# Altium footprint library ParsaLibrary.PcbLib: 526 footprints (part 7 of 33)
Each footprint in its own frame and in the unit in brackets; x right, y up, seen from the top. Pads: shape width x height; smd on the part's side, far side on the other; paste and mask are expansions set on the pad; w line width, h text height; cw(c..) or ccw(c..) is an arc to the next point about the centre after c.
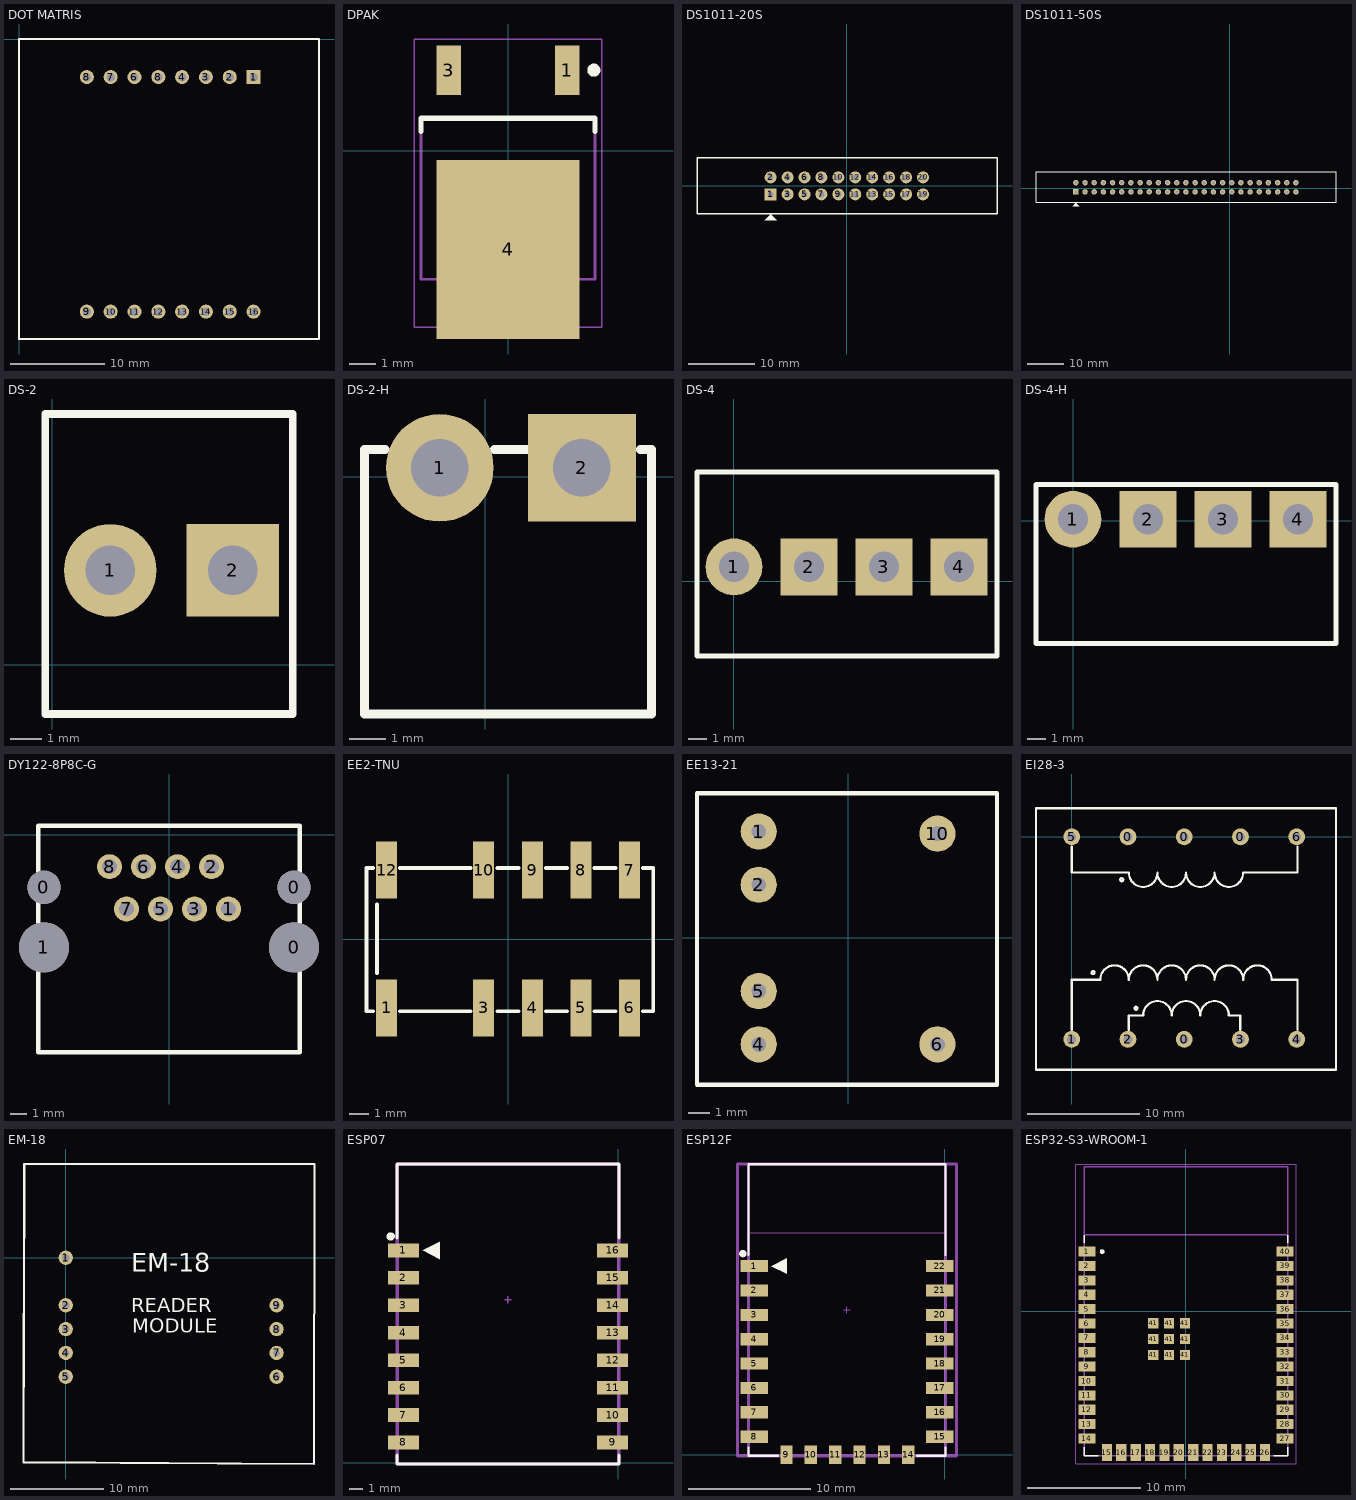
[diagram p6: the footprints below, top view; thin cyan lines are the x and y axes]

## DOT MATRIS [mm]
pads (16):
  rect 1.5x1.5 hole 0.9: 1(25.019,-4.064)
  round 1.5 hole 0.9: 2(22.479,-4.064) 3(19.939,-4.064) 4(17.399,-4.064) 6(12.319,-4.064) 7(9.779,-4.064) 8(7.239,-4.064) 8(14.859,-4.064) 9(7.239,-29.083) 10(9.779,-29.083) 11(12.319,-29.083) 12(14.859,-29.083) 13(17.399,-29.083) 14(19.939,-29.083) 15(22.479,-29.083) 16(25.019,-29.083)
Top Overlay:
  lines w0.2: 0,-32 32,-32 32,0 0,0 0,-32
3D body: height 8.25, standoff 0, extent -0.025,-32.004 32.029,0.09

## DPAK [mm]
pads (3):
  rect 0.95x1.9 smd: 1(2.28,3.1) 3(-2.28,3.1)
  rect 5.5x6.9 smd: 4(0,-3.8)
Top Overlay:
  circle w0.25: c3.305,3.1 r0.125
  lines w0.2: -3.35,0.75 -3.35,1.25 3.35,1.25 3.35,0.75
Mechanical 13:
  lines w0.1: -3.35,-4.95 -3.35,1.25 3.35,1.25 3.35,-4.95 -3.35,-4.95
Mechanical 15:
  lines w0.05: -3.6,-6.8 -3.6,4.3 3.6,4.3 3.6,-6.8 -3.6,-6.8
  lines w0.1: -0.5,-1.25 0.5,-1.25 ; 0,-1.75 0,-0.75
3D body "User Library-DPAK-1.step": height 2.34, standoff -0.07, extent -3.27,-6.528 3.27,3.411

## DS1011-20S [mm]
pads (20):
  rect 1.8x1.8 hole 0.9: 1(-11.43,-1.27)
  round 1.8 hole 0.9: 2(-11.43,1.27) 3(-8.89,-1.27) 4(-8.89,1.27) 5(-6.35,-1.27) 6(-6.35,1.27) 7(-3.81,-1.27) 8(-3.81,1.27) 9(-1.27,-1.27) 10(-1.27,1.27) 11(1.27,-1.27) 12(1.27,1.27) 13(3.81,-1.27) 14(3.81,1.27) 15(6.35,-1.27) 16(6.35,1.27) 17(8.89,-1.27) 18(8.89,1.27) 19(11.43,-1.27) 20(11.43,1.27)
Top Overlay:
  region: -11.43,-4.267 -12.344,-5.182 -10.516,-5.182
  lines w0.2: -22.479,-4.191 22.53,-4.191 22.53,4.242 -22.479,4.242 -22.479,-4.191
3D body "User Library-Header-IDC10x2-LongLevers.step": height 25.84, standoff -3.2, extent -22.5,-4.25 22.5,4.25

## DS1011-50S [mm]
pads (50):
  rect 1.5x1.5 hole 0.9: 1(-42.57,-1.041)
  round 1.5 hole 0.9: 2(-42.57,1.499) 3(-40.03,-1.041) 4(-40.03,1.499) 5(-37.49,-1.041) 6(-37.49,1.499) 7(-34.95,-1.041) 8(-34.95,1.499) 9(-32.41,-1.041) 10(-32.41,1.499) 11(-29.87,-1.041) 12(-29.87,1.499) 13(-27.33,-1.041) 14(-27.33,1.499) 15(-24.79,-1.041) 16(-24.79,1.499) 17(-22.25,-1.041) 18(-22.25,1.499) 19(-19.71,-1.041) 20(-19.71,1.499) 21(-17.17,-1.041) 22(-17.17,1.499) 23(-14.63,-1.041) 24(-14.63,1.499) 25(-12.09,-1.041) 26(-12.09,1.499) 27(-9.55,-1.041) 28(-9.55,1.499) 29(-7.01,-1.041) 30(-7.01,1.499) 31(-4.47,-1.041) 32(-4.47,1.499) 33(-1.93,-1.041) 34(-1.93,1.499) 35(0.61,-1.041) 36(0.61,1.499) 37(3.15,-1.041) 38(3.15,1.499) 39(5.69,-1.041) 40(5.69,1.499) 41(8.23,-1.041) 42(8.23,1.499) 43(10.77,-1.041) 44(10.77,1.499) 45(13.31,-1.041) 46(13.31,1.499) 47(15.85,-1.041) 48(15.85,1.499) 49(18.39,-1.041) 50(18.39,1.499)
Top Overlay:
  region: -42.57,-4.039 -43.485,-4.953 -41.656,-4.953
  lines w0.2: -53.619,-3.962 29.489,-3.962 29.489,4.47 -53.619,4.47 -53.619,-3.962

## DS-2 [mm]
pads (2):
  round 3 hole 1.6: 1(1.87,3.048)
  rect 3x3 hole 1.6: 2(5.83,3.048)
Top Overlay:
  lines w0.254: -0.231,-1.599 -0.231,8.101 7.77,8.101 7.77,-1.599 -0.231,-1.599
3D body "User Library-Cvilux_CI5102P1V00.STEP": height 13.9, standoff -3.6, extent -0.15,-1.599 7.77,8.001

## DS-2-H [mm]
pads (2):
  round 3 hole 1.6: 1(-1.27,0.254)
  rect 3x3 hole 1.6: 2(2.69,0.254)
Top Overlay:
  lines w0.254: -2.794,0.762 -3.371,0.762 -3.371,-6.604 4.63,-6.604 4.63,0.762 4.318,0.762 ; 0.254,0.762 1.143,0.762
3D body "User Library-Cvilux_CI5102P1H00.STEP": height 9.6, standoff -3.6, extent -3.25,-18.577 4.67,0.793

## DS-4 [mm]
pads (4):
  round 3 hole 1.6: 1(0,0.762)
  rect 3x3 hole 1.6: 2(3.96,0.762) 3(7.92,0.762) 4(11.88,0.762)
Top Overlay:
  lines w0.254: -1.951,-3.937 13.889,-3.937 13.889,5.763 -1.951,5.763 -1.951,-3.937
3D body "User Library-Cvilux_CI5104P1V00.STEP": height 13.9, standoff -3.6, extent -1.951,-3.937 13.889,5.663

## DS-4-H [mm]
pads (4):
  round 3 hole 1.6: 1(-0.029,0.079)
  rect 3x3 hole 1.6: 2(3.931,0.079) 3(7.891,0.079) 4(11.851,0.079)
Top Overlay:
  lines w0.254: -1.98,-6.477 13.86,-6.477 13.86,1.905 -1.98,1.905 -1.98,-6.477
3D body "User Library-Cvilux_CI5104P1H00.STEP": height 9.6, standoff -3.6, extent -1.98,-18.704 13.86,0.666

## DY122-8P8C-G [mm]
pads (12):
  round 2 hole 2: 0(-7.502,-3.145) 0(7.498,-3.145)
  round 3 hole 3: 0(7.498,-6.745) 1(-7.502,-6.745)
  round 1.5 hole 0.9: 1(3.568,-4.445) 2(2.548,-1.905) 3(1.528,-4.445) 4(0.508,-1.905) 5(-0.512,-4.445) 6(-1.532,-1.905) 7(-2.552,-4.445) 8(-3.572,-1.905)
Top Overlay:
  lines w0.254: -7.852,-13.045 -7.852,0.555 7.848,0.555 7.848,-13.045 -7.852,-13.045

## EE2-TNU [mm]
pads (10):
  rect 1.1x3 smd: 1(-6.35,-3.61) 3(-1.27,-3.61) 4(1.27,-3.61) 5(3.81,-3.61) 6(6.35,-3.61) 7(6.35,3.61) 8(3.81,3.61) 9(1.27,3.61) 10(-1.27,3.61) 12(-6.35,3.61)
Top Overlay:
  lines w0.2: -7.05,-3.785 -7.4,-3.785 -7.4,3.71 -7.05,3.71 ; -6.85,-1.79 -6.85,1.81 ; -5.65,-3.785 -1.95,-3.785 ; -5.65,3.71 -1.95,3.71 ; -0.55,-3.785 0.55,-3.785 ; -0.55,3.71 0.55,3.71 ; 1.99,-3.785 3.09,-3.785 ; 1.99,3.71 3.09,3.71 ; 4.53,-3.785 5.63,-3.785 ; 4.53,3.71 5.63,3.71 ; 7.05,-3.785 7.6,-3.785 7.6,3.71 7.05,3.71

## EE13-21 [mm]
pads (6):
  round 1.7 hole 0.7: 1(-4.2,5) 2(-4.2,2.5) 4(-4.2,-5) 5(-4.2,-2.5) 6(4.2,-5) 10(4.2,4.9)
Top Overlay:
  lines w0.2: -7.1,-6.9 -7.1,6.8 7,6.8 7,-6.9 -7.1,-6.9
3D body "EE13.STEP": height 13.86, standoff -2.92, extent -6.909,-6.83 6.909,6.8

## EI28-3 [mm]
pads (10):
  round 1.5 hole 0.8: 0(5,0) 0(10,-18) 0(10,0) 0(15,0) 1(0,-18) 2(5,-18) 3(15,-18) 4(20,-18) 5(0,0) 6(20,0)
Top Overlay:
  circle w0.2: c4.445,-3.81 r0.127
  circle w0.2: c5.715,-15.24 r0.127
  circle w0.2: c1.905,-12.065 r0.127
  lines w0.2: 0,-17.145 0,-12.7 2.54,-12.7 cw(c3.81,-12.694) 5.08,-12.7 cw(c6.35,-12.694) 7.62,-12.7 cw(c8.89,-12.694) 10.16,-12.7 cw(c11.43,-12.694) 12.7,-12.7 cw(c13.97,-12.694) 15.24,-12.7 cw(c16.51,-12.694) 17.78,-12.7 20.066,-12.7 20.066,-17.145 ; 0,-0.889 0,-3.175 5.08,-3.175 ccw(c6.35,-3.181) 7.62,-3.175 ccw(c8.89,-3.181) 10.16,-3.175 ccw(c11.43,-3.181) 12.7,-3.175 ccw(c13.97,-3.181) 15.24,-3.175 20.066,-3.175 20.066,-0.889 ; 5.08,-17.145 5.08,-15.875 6.35,-15.875 cw(c7.62,-15.869) 8.89,-15.875 cw(c10.16,-15.869) 11.43,-15.875 cw(c12.7,-15.869) 13.97,-15.875 14.986,-15.875 14.986,-17.145 ; -3.175,-20.701 -3.175,2.54 23.495,2.54 23.495,-20.701 -3.175,-20.701

## EM-18 [mil] "RFID Reader Module"
pads (9):
  round 60 hole 30: 1(0,0) 2(0,-200) 3(0,-300) 4(0,-400) 5(0,-500) 6(885.83,-500) 7(885.83,-400) 8(885.83,-300) 9(885.83,-200)
Top Overlay:
  lines w10: 1042.91,-866.86 -177.8,-860 -175,393.7 1045,393.7 1042.92,-865
  text "MODULE" at 280,-315 h60
  text "READER" at 275,-230 h60
  text "EM-18" at 275,-60 h78.74

## ESP07 [mm]
pads (16):
  rect 2.25x1 smd: 1(-15.655,15.492) 2(-15.655,13.492) 3(-15.655,11.492) 4(-15.655,9.492) 5(-15.655,7.492) 6(-15.655,5.492) 7(-15.655,3.492) 8(-15.655,1.492) 9(-0.405,1.492) 10(-0.405,3.492) 11(-0.405,5.492) 12(-0.405,7.492) 13(-0.405,9.492) 14(-0.405,11.492) 15(-0.405,13.492) 16(-0.405,15.492)
Top Overlay:
  circle w0.3: c-16.58,16.517 r0.15
  region: -14.26,15.492 -12.99,14.857 -12.99,16.127
  lines w0.2: -16.114,0.576 -16.114,-0.076 0.054,-0.076 0.054,0.576 ; -16.114,16.408 -16.114,21.795 0.054,21.795 0.054,16.408
Mechanical 13:
  lines w0.254: -16.114,-0.076 -16.114,21.781 0.054,21.781 0.054,-0.076 -16.114,-0.076
Mechanical 15:
  lines w0.1: -8.284,11.893 -7.776,11.893 ; -8.03,11.639 -8.03,12.147
3D body "User Library-ESP07-1.step": height 4, standoff 0.49, extent -15.968,-0.203 0.032,21.797

## ESP12F [mm]
pads (22):
  rect 2.25x1 smd: 1(-15.655,15.492) 2(-15.655,13.492) 3(-15.655,11.492) 4(-15.655,9.492) 5(-15.655,7.492) 6(-15.655,5.492) 7(-15.655,3.492) 8(-15.655,1.492) 15(-0.405,1.492) 16(-0.405,3.492) 17(-0.405,5.492) 18(-0.405,7.492) 19(-0.405,9.492) 20(-0.405,11.492) 21(-0.405,13.492) 22(-0.405,15.492)
  rect 1x1.5 smd: 9(-13,0) 10(-11,0) 11(-9,0) 12(-7,0) 13(-5,0) 14(-3,0)
Top Overlay:
  circle w0.3: c-16.58,16.517 r0.15
  region: -14.26,15.492 -12.99,14.857 -12.99,16.127
  lines w0.2: -16.114,0.576 -16.114,-0.076 -13.724,-0.076 ; -16.114,16.408 -16.114,23.863 0.054,23.863 0.054,16.408 ; -2.276,-0.076 0.054,-0.076 0.054,0.576
Mechanical 13:
  lines w0.051: -16.157,18.219 0.099,18.219 0.099,23.874 -16.157,23.874 -16.157,18.219
  lines w0.254: -16.114,-0.076 -16.114,23.863 0.054,23.863 0.054,-0.076 -16.114,-0.076
  text "ANTENNA AREA" at -13.081,21.209 h0.8
  text "CUTOUT POLYGON" at -13.6,19.3 h0.8
Mechanical 15:
  lines w0.1: -8.284,11.893 -7.776,11.893 ; -8.03,11.639 -8.03,12.147
  lines w0.254: -17.005,-0.076 0.945,-0.076 0.945,23.863 -17.005,23.863 -17.005,-0.076
3D body "ESP_12_E.STEP": height 2.75, standoff 0.04, extent -16.029,0.001 -0.029,24.001

## ESP32-S3-WROOM-1 [mm]
pads (49):
  rect 1.5x0.9 smd: 1(-8.75,5.26) 2(-8.75,3.99) 3(-8.75,2.72) 4(-8.75,1.45) 5(-8.75,0.18) 6(-8.75,-1.09) 7(-8.75,-2.36) 8(-8.75,-3.63) 9(-8.75,-4.9) 10(-8.75,-6.17) 11(-8.75,-7.44) 12(-8.75,-8.71) 13(-8.75,-9.98) 14(-8.75,-11.25) 27(8.75,-11.25) 28(8.75,-9.98) 29(8.75,-8.71) 30(8.75,-7.44) 31(8.75,-6.17) 32(8.75,-4.9) 33(8.75,-3.63) 34(8.75,-2.36) 35(8.75,-1.09) 36(8.75,0.18) 37(8.75,1.45) 38(8.75,2.72) 39(8.75,3.99) 40(8.75,5.26)
  rect 0.9x1.5 smd: 15(-6.985,-12.5) 16(-5.715,-12.5) 17(-4.445,-12.5) 18(-3.175,-12.5) 19(-1.905,-12.5) 20(-0.635,-12.5) 21(0.635,-12.5) 22(1.905,-12.5) 23(3.175,-12.5) 24(4.445,-12.5) 25(5.715,-12.5) 26(6.985,-12.5)
  rect 0.9x0.9 smd: 41(-2.9,-3.86) 41(-2.9,-2.46) 41(-2.9,-1.06) 41(-1.5,-3.86) 41(-1.5,-2.46) 41(-1.5,-1.06) 41(-0.1,-3.86) 41(-0.1,-2.46) 41(-0.1,-1.06)
Top Overlay:
  circle w0.2: c-7.406,5.26 r0.1
  lines w0.127: -9,-12.02 -9,-12.75 -7.755,-12.75 ; -9,6.03 -9,6.7 ; 7.755,-12.75 9,-12.75 9,-12.02 ; 9,6.03 9,6.7
Mechanical 13:
  circle w0.2: c-7.406,5.26 r0.1
  lines w0.127: -9,6.75 9,6.75 ; -9,6.75 -9,12.75 9,12.75 9,6.75 ; -9,6.75 -9,-12.75 9,-12.75 9,6.75
Mechanical 15:
  lines w0.05: -9.75,-13.5 9.75,-13.5 9.75,13 -9.75,13 -9.75,-13.5
3D body "ESP32-S3-WROOM-1-N8R2--3DModel-STEP-56544.STEP": height 3.25, standoff 0, extent -9,-12.75 9,12.75